# Altium footprint library STM32_1_PcbLib1.PcbLib: 40 footprints (part 3 of 3)
Each footprint in its own frame and in the unit in brackets; x right, y up, seen from the top. Pads: shape width x height; smd on the part's side, far side on the other; paste and mask are expansions set on the pad; w line width, h text height; cw(c..) or ccw(c..) is an arc to the next point about the centre after c.
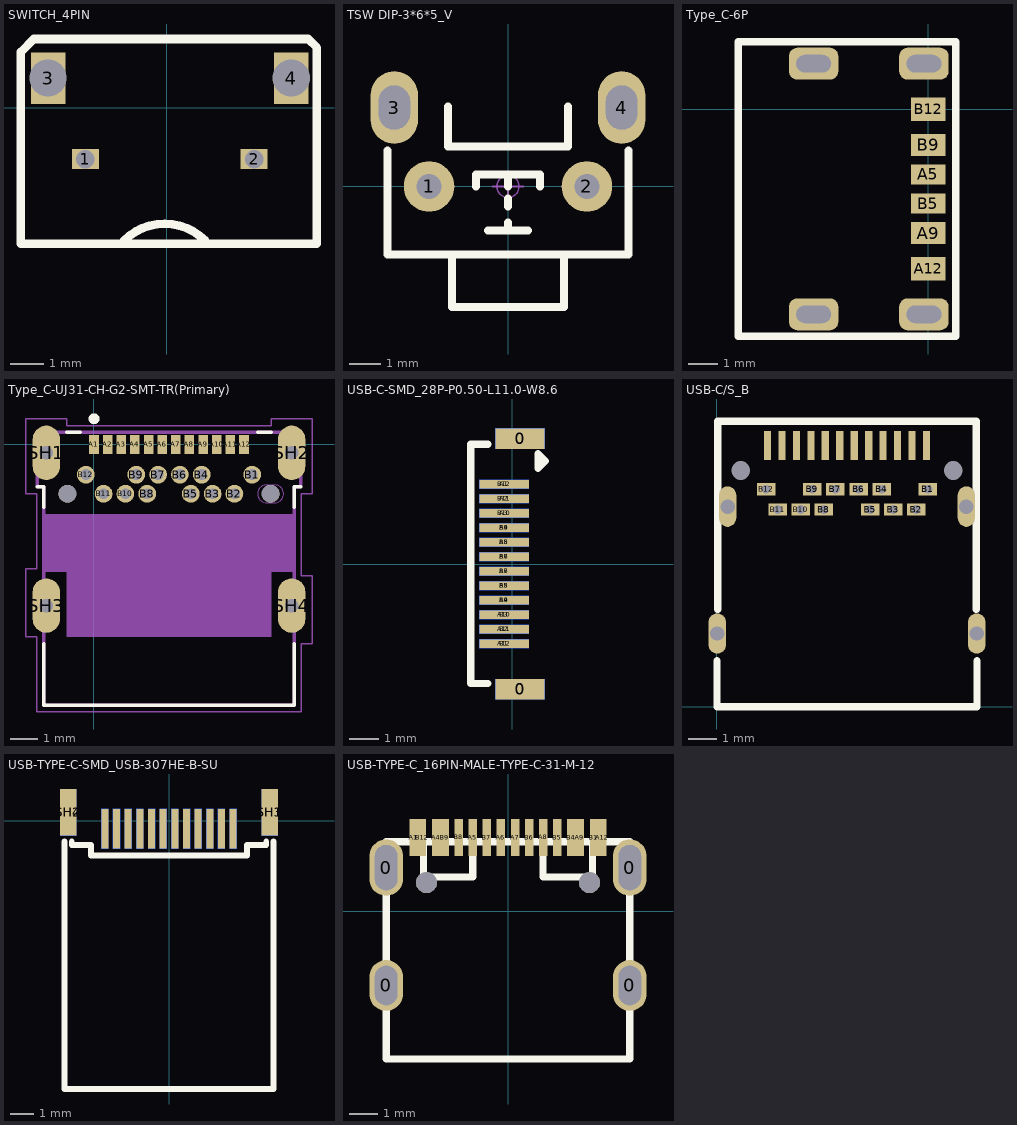
[diagram p2: the footprints below, top view; thin cyan lines are the x and y axes]

## SWITCH_4PIN [mm]
pads (4):
  rect 0.8x0.6 hole 0.55 square: 1(-2.413,-1.524) 2(2.587,-1.524)
  rect 1.016x1.524 hole 1.1 square: 3(-3.513,0.876) 4(3.687,0.876)
Top Overlay:
  lines w0.254: -1.27,-3.937 cw(c-0.064,-5.143) 1.143,-3.937 ; -4.318,-4.032 4.445,-4.032 4.445,-2.032 4.445,1.778 4.191,2.032 -3.937,2.032 -4.318,1.651 -4.318,-2.032 -4.318,-4.032

## TSW DIP-3*6*5_V [mm] "侧按轻触开关 3*6*5mm"
pads (4):
  round 1.6 hole 0.8: 1(-2.5,0) 2(2.5,0)
  oval 1.5x2.3 hole 1.4 slot 1 at 0 deg: 3(-3.6,2.5) 4(3.6,2.5)
Top Overlay:
  lines w0.254: -3.81,1.143 -3.81,-2.159 3.81,-2.159 3.81,1.143 ; -1.905,2.54 -1.905,1.27 1.905,1.27 1.905,2.54 ; -1.778,-2.159 -1.778,-3.81 1.778,-3.81 1.778,-2.159 ; -1.016,0 -1.016,0.381 1.016,0.381 1.016,0 ; -0.635,-1.397 0.635,-1.397 ; 0,-1.397 0,-1.143 ; 0,-0.635 0,-0.381 ; 0,0 0,0.381
Mechanical 15:
  circle w0.05: c0,0 r0.35
  lines w0.05: -0.5,0 0.5,0 ; 0,-0.5 0,0.5
3D body "TSW DIP-3x6x5_V.STEP": height 4.45, standoff -2.8, extent -3.996,-3.75 3.996,3.5

## Type_C-6P [mm]
pads (10):
  rect 1.2x0.7 smd: A5(0,-2.25) B5(0,-3.25)
  rect 1.2x0.76 smd: A9(0,-4.27) B9(0,-1.23)
  rect 1.2x0.8 smd: A12(0,-5.5) B12(0,0)
  rrect50% 1.7x1.1 hole 0.6 slot 1.2 at 0 deg: ""(-3.95,-7.07) ""(-3.95,1.57) ""(-0.15,-7.07) ""(-0.15,1.57)
Top Overlay:
  lines w0.254: -6.547,-7.83 0.946,-7.83 0.946,2.33 -6.547,2.33 -6.547,-7.83
3D body "USB TYPE-C 3.1smple.STEP": height 3.18, standoff -0.9, extent -6.589,-7.22 0.311,1.72

## Type_C-UJ31-CH-G2-SMT-TR(Primary) [mm]
pads (30):
  rect 0.35x0.7 smd: A1(0,0) A2(0.5,0) A3(1,0) A4(1.5,0) A5(2,0) A6(2.5,0) A7(3,0) A8(3.5,0) A9(4,0) A10(4.5,0) A11(5,0) A12(5.5,0)
  round 0.65 hole 0.4: B1(5.8,-1.11) B2(5.15,-1.81) B3(4.35,-1.81) B4(3.95,-1.11) B5(3.55,-1.81) B6(3.15,-1.11) B7(2.35,-1.11) B8(1.95,-1.81) B9(1.55,-1.11) B10(1.15,-1.81) B11(0.35,-1.81) B12(-0.3,-1.11)
  round 0.65 hole 0.65 unplated: None(-0.975,-1.81) None(6.475,-1.81)
  oval 1x2 hole 0.5: SH1(-1.75,-0.31) SH2(7.25,-0.31) SH3(-1.75,-5.91) SH4(7.25,-5.91)
Top Overlay:
  circle w0.2: c0,0.94 r0.1
  lines w0.127: -2.075,-1.56 -1.85,-1.56 -1.85,-2.31 ; -1.85,-7.31 -1.85,-9.56 7.35,-9.56 7.35,-7.31 ; -1,0.44 -0.5,0.44 ; 6,0.44 6.5,0.44 ; 7.35,-2.31 7.35,-1.56 7.575,-1.56
Mechanical 1:
  lines w0: -2,-6.31 ccw(c-1.75,-6.31) -1.5,-6.31 -1.5,-5.51 ccw(c-1.75,-5.51) -2,-5.51 -2,-6.31 ; -2,-0.61 ccw(c-1.75,-0.61) -1.5,-0.61 -1.5,-0.01 ccw(c-1.75,-0.01) -2,-0.01 -2,-0.61 ; 6.325,-2.135 cw(c6.325,-1.81) 6.325,-1.485 6.625,-1.485 cw(c6.625,-1.81) 6.625,-2.135 6.325,-2.135 ; 7,-6.31 ccw(c7.25,-6.31) 7.5,-6.31 7.5,-5.51 ccw(c7.25,-5.51) 7,-5.51 7,-6.31 ; 7,-0.61 ccw(c7.25,-0.61) 7.5,-0.61 7.5,-0.01 ccw(c7.25,-0.01) 7,-0.01 7,-0.61
Mechanical 4:
  region: -1.85,-2.56 7.35,-2.56 7.35,-4.66 6.5,-4.66 6.5,-7.06 -1,-7.06 -1,-4.66 -1.85,-4.66
  region: -1.85,-2.56 7.35,-2.56 7.35,-4.66 6.5,-4.66 6.5,-7.06 -1,-7.06 -1,-4.66 -1.85,-4.66
  region: -1.85,-2.56 7.35,-2.56 7.35,-4.66 6.5,-4.66 6.5,-7.06 -1,-7.06 -1,-4.66 -1.85,-4.66
  region: -1.85,-2.56 7.35,-2.56 7.35,-4.66 6.5,-4.66 6.5,-7.06 -1,-7.06 -1,-4.66 -1.85,-4.66
  lines w0.127: -2.075,-1.56 -1.85,-1.56 ; -2.075,-1.56 -2.075,0.44 ; -2.075,-1.56 -1.85,-1.56 ; -2.075,-1.56 -2.075,0.44 ; -2.075,0.44 7.575,0.44 ; -2.075,0.44 7.575,0.44 ; -1.85,-9.56 7.35,-9.56 ; -1.85,-9.56 -1.85,-1.56 ; -1.85,-9.56 7.35,-9.56 ; -1.85,-9.56 -1.85,-1.56 ; 7.35,-9.56 7.35,-1.56 ; 7.35,-9.56 7.35,-1.56 ; 7.35,-1.56 7.575,-1.56 ; 7.35,-1.56 7.575,-1.56 ; 7.575,-1.56 7.575,0.44 ; 7.575,-1.56 7.575,0.44
Mechanical 16:
  lines w0.05: -2.5,-7.06 -2.1,-7.06 -2.1,-9.81 7.6,-9.81 7.6,-7.31 8,-7.31 8,-4.81 7.6,-4.81 7.6,-1.81 8,-1.81 8,0.94 6.5,0.94 6.5,0.69 -1,0.69 -1,0.94 -2.5,0.94 -2.5,-1.81 -2.1,-1.81 -2.1,-4.56 -2.5,-4.56 -2.5,-7.06
3D body "CUI_UJ31-CH-G2-SMT-TR.step": height 4.5, standoff -1.16, extent -2.062,-9.612 7.65,0.388

## USB-C-SMD_28P-P0.50-L11.0-W8.6 [mil]
pads (28):
  rect 66.9x27.5 smd far side: 0(10.81,-170.07)
  rect 66.9x27.5 smd: 0(10.81,-170.07)
  rect 66.9x27.6 smd far side: 0(10.81,170.08)
  rect 66.9x27.6 smd: 0(10.81,170.08)
  rect 67x11.8 smd: A1(-10.84,108.28) A2(-10.84,88.68) A3(-10.84,68.98) A5(-10.84,29.68) A6(-10.84,9.98) A7(-10.84,-9.72) A8(-10.84,-29.42) A9(-10.84,-49.12) A10(-10.84,-68.82) A12(-10.84,-108.12)
  rect 67x11.9 smd: A4(-10.84,49.33) A11(-10.84,-88.47)
  rect 67x11.8 smd far side: B1(-10.84,-108.32) B2(-10.84,-88.62) B3(-10.84,-68.92) B4(-10.84,-49.22) B5(-10.84,-29.52) B6(-10.84,-9.82) B8(-10.84,29.48) B9(-10.84,49.18) B10(-10.84,68.88) B11(-10.84,88.58) B12(-10.84,108.28)
  rect 67x11.9 smd far side: B7(-10.84,9.83)
Top Overlay:
  lines w10: -56.13,-132.33 -56.13,-162.22 -32.84,-162.22 ; -56.13,-131.93 -56.13,131.78 ; -56.13,132.78 -56.13,162.67 -32.84,162.67 ; -55.94,132.57 -55.94,162.57 -32.64,162.57 ; 35.16,129.97 44.97,139.78 35.16,149.57 35.16,129.97

## USB-C/S_B [mm]
pads (30):
  rect 0.25x1 smd: A1(1.75,9.037) A2(2.25,9.037) A3(2.75,9.037) A4(3.25,9.037) A5(3.75,9.037) A6(4.25,9.037) A7(4.75,9.037) A8(5.25,9.037) A9(5.75,9.037) A10(6.25,9.037) A11(6.75,9.037) A12(7.25,9.037)
  rect 0.64x0.42 hole 0.3: B1(7.3,7.52) B2(6.9,6.82) B3(6.1,6.82) B4(5.7,7.52) B5(5.3,6.82) B6(4.9,7.52) B7(4.1,7.52) B8(3.7,6.82) B9(3.3,7.52) B10(2.9,6.82) B11(2.1,6.82) B12(1.7,7.52)
  oval 0.6x1.4 hole 0.5 square: ""(0.01,2.53) ""(0.37,6.92) ""(8.63,6.92) ""(8.99,2.53)
  round 0 hole 0.65: ""(0.825,8.17) ""(8.175,8.17)
Top Overlay:
  lines w0.254: 0,1.583 0,0 9,0 9,1.583 ; 0.025,3.37 0.025,9.87 8.975,9.87 8.975,3.37

## USB-TYPE-C-SMD_USB-307HE-B-SU [mm]
pads (28):
  rect 0.3x1.702 smd: A1(-2.749,-0.35) A3(-1.751,-0.35) A4(-1.25,-0.35) A5(-0.75,-0.35) A6(-0.25,-0.35) A7(0.251,-0.35) A8(0.751,-0.35) A9(1.249,-0.35) A10(1.749,-0.35) A11(2.25,-0.35) A12(2.75,-0.35)
  rect 0.302x1.702 smd: A2(-2.25,-0.35)
  rect 0.3x1.702 smd far side: B1(2.75,-0.35) B2(2.25,-0.35) B3(1.749,-0.35) B4(1.249,-0.35) B5(0.751,-0.35) B6(0.251,-0.35) B7(-0.25,-0.35) B8(-0.75,-0.35) B9(-1.25,-0.35) B10(-1.751,-0.35) B12(-2.749,-0.35)
  rect 0.302x1.702 smd far side: B11(-2.25,-0.35)
  rect 0.701x2.002 smd: SH1(4.32,0.35)
  rect 0.699x2.002 smd: SH2(-4.32,0.35)
  rect 0.701x2.002 smd far side: SH3(4.32,0.35)
  rect 0.699x2.002 smd far side: SH4(-4.32,0.35)
Top Overlay:
  lines w0.254: -4.473,-0.899 -4.473,-11.508 4.473,-11.508 ; -4.17,-0.899 -4.17,-1.054 -3.349,-1.054 -3.349,-1.501 0,-1.501 3.348,-1.501 3.348,-1.054 4.169,-1.054 4.169,-0.899 ; 4.473,-11.508 4.473,-0.899
Bottom Overlay:
  lines w0.254: -4.473,-11.508 -4.473,-0.899 ; -4.473,-11.507 4.473,-11.507 ; -4.17,-0.899 -4.17,-1.054 -3.348,-1.054 -3.348,-1.5 0,-1.5 3.348,-1.5 3.348,-1.054 4.17,-1.054 4.17,-0.899 ; 4.473,-11.508 4.473,-0.899

## USB-TYPE-C_16PIN-MALE-TYPE-C-31-M-12 [mm]
pads (22):
  oval 1.2x1.8 hole 0.8 slot 1.4 at 90 deg: 0(-4.32,-2.624) 0(4.32,-2.624)
  oval 1.2x2 hole 0.8 slot 1.6 at 90 deg: 0(-4.32,1.556) 0(4.32,1.556)
  rect 0.3x1.3 smd: A1(-3.35,2.623) A4(-2.55,2.623) A5(-1.25,2.623) A6(-0.25,2.623) A7(0.25,2.623) A8(1.25,2.624) A9(2.55,2.623) A12(3.35,2.623) B1(3.05,2.623) B4(2.25,2.623) B5(1.75,2.623) B6(0.75,2.623) B7(-0.75,2.623) B8(-1.75,2.624) B9(-2.25,2.623) B12(-3.05,2.623)
  round 0.75 hole 0.75 unplated: ""(-2.89,1.026) ""(2.89,1.026)
Top Overlay:
  lines w0.254: -3,2.471 -3,1.221 -1.25,1.221 -1.25,2.471 ; 1.247,2.473 1.247,1.223 2.997,1.223 2.997,2.473 ; -4.32,-5.227 -4.32,2.471 4.32,2.471 4.32,-5.227 -4.32,-5.227
3D body "USB TYPE-C 3.1smple.STEP": height 3.28, standoff -0.8, extent -4.69,-4.77 4.25,2.13
3D body: height 1.1, standoff 0, extent -2.03,-1.55 -2.03,-1.55